# Altium schematic symbol library LATTICEPLDS_Library.SchLib: 291 symbols (part 1 of 32) (continued)
## iCE40HX8K-CT256 (continued)
part E pins: N13 VCC_SPI (power), P11 IOB_106_SDI (io), P12 IOB_105_SDO (io), R11 IOB_107_SCK (io), R12 IOB_108_SS (io)
part F pins: A4 GND (power), A12 GND (power), A14 VCC (power), D12 VPP_FAST (power), E7 GNDPLL1 (power), E8 VCCPLL1 (power), E12 VPP_2V5 (power), E15 GND (power), F6 VCC (power), F10 VCC (power), G7 GND (power), G8 GND (power), G9 GND (power), H7 GND (power), H8 GND (power), H9 GND (power), J7 GND (power), J8 GND (power), J9 GND (power), K2 GND (power), K6 VCC (power), K7 GND (power), K10 VCC (power), L2 VCC (power), L8 VCCPLL0 (power), L15 GND (power), N8 GNDPLL0 (power), N14 NC (power), R7 GND (power), T4 GND (power), T12 GND (power)
part A text: BANK0
part B text: BANK1
part C text: BANK2
part D text: BANK3
part E text: SPI
part F text: POWER

## iCE40LM1K-CM36
designator U?
pins: A1 PIOT_A1 / I2C2_SDA (io), A2 PIOT_A2 (power), A3 PIOT_A3HD (io), A4 PIOT_A4HD (io), A5 PIOT_A5HD (io), A6 PIOT_A6 / I2C1_SCL (io), B1 PIOT_B1 (io), B2 PIOT_B2 / I2C2_SCL (io), B3 PIOT_B3 / G7 (io), B4 PIOT_B4 / G2 (power), B5 PIOT_B5 / I2C1_SDA (io), B6 PIOT_B6 (io), C1 PIOB_C1 / SPI2_CSN (io), C2 Vccio_0 (power), C3 GND (power), C4 Vcc_12 (power), C5 PIOT_C5 (io), C6 PIOB_C6 / SPI1_MISO (io), D1 PIOB_D1 / SPI2_MOSI  /  G1 (io), D2 VCCPLL (power), D3 Vccio_2 (power), D4 GND (power), D5 CRESETB (io), D6 PIOB_D6 / SPI1_SCK (io), E1 PIOB_E1 /  SPI2_SCK (io), E2 PIOB_E2 / G3 (io), E3 PIOB_E3 (io), E4 CDONE (io), E5 PIOB_E5 (io), E6 PIOB_E6 / SPI1_CSN (io), F1 PIOB_F1 / SPI2_MISO (io), F2 PIOB_F2 (io), F3 PIOB_F3 / G6 (io), F4 PIOB_F4 / G0 (io), F5 PIOB_F5 (io), F6 PIOB_F6 / SPI1_MOSI (io)
text: BANK TOP; BANK BOTTOM

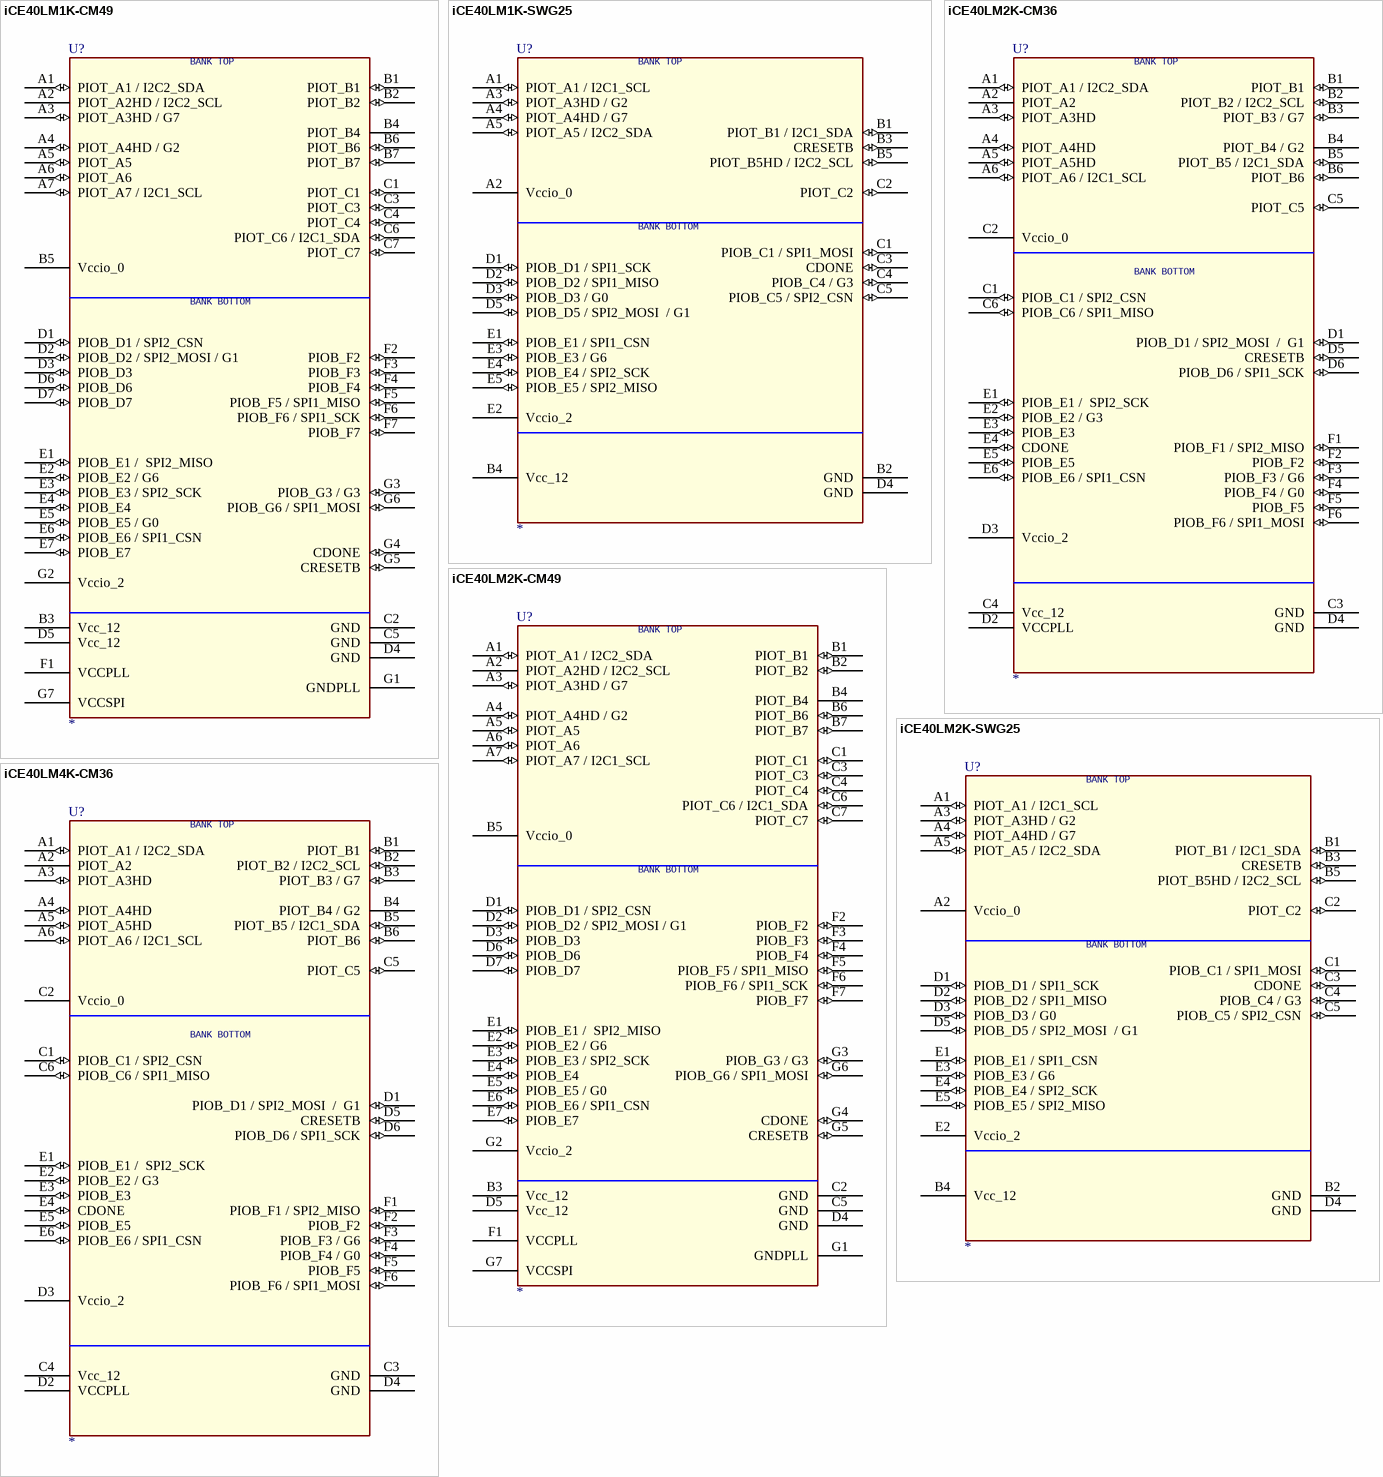
[diagram p7: symbols iCE40LM1K-CM49 to iCE40LM4K-CM36]

## iCE40LM1K-CM49
designator U?
pins: A1 PIOT_A1 / I2C2_SDA (io), A2 PIOT_A2HD / I2C2_SCL (power), A3 PIOT_A3HD / G7 (io), A4 PIOT_A4HD / G2 (io), A5 PIOT_A5 (io), A6 PIOT_A6 (io), A7 PIOT_A7 / I2C1_SCL (io), B1 PIOT_B1 (io), B2 PIOT_B2 (io), B3 Vcc_12 (power), B4 PIOT_B4 (power), B5 Vccio_0 (power), B6 PIOT_B6 (io), B7 PIOT_B7 (io), C1 PIOT_C1 (io), C2 GND (power), C3 PIOT_C3 (io), C4 PIOT_C4 (io), C5 GND (power), C6 PIOT_C6 / I2C1_SDA (io), C7 PIOT_C7 (io), D1 PIOB_D1 / SPI2_CSN (io), D2 PIOB_D2 / SPI2_MOSI / G1 (io), D3 PIOB_D3 (io), D4 GND (power), D5 Vcc_12 (power), D6 PIOB_D6 (io), D7 PIOB_D7 (io), E1 PIOB_E1 /  SPI2_MISO (io), E2 PIOB_E2 / G6 (io), E3 PIOB_E3 / SPI2_SCK (io), E4 PIOB_E4 (io), E5 PIOB_E5 / G0 (io), E6 PIOB_E6 / SPI1_CSN (io), E7 PIOB_E7 (io), F1 VCCPLL (power), F2 PIOB_F2 (io), F3 PIOB_F3 (io), F4 PIOB_F4 (io), F5 PIOB_F5 / SPI1_MISO (io), F6 PIOB_F6 / SPI1_SCK (io), F7 PIOB_F7 (io), G1 GNDPLL (power), G2 Vccio_2 (power), G3 PIOB_G3 / G3 (io), G4 CDONE (io), G5 CRESETB (io), G6 PIOB_G6 / SPI1_MOSI (io), G7 VCCSPI (power)
text: BANK TOP; BANK BOTTOM

## iCE40LM1K-SWG25
designator U?
pins: A1 PIOT_A1 / I2C1_SCL (io), A2 Vccio_0 (power), A3 PIOT_A3HD / G2 (io), A4 PIOT_A4HD / G7 (io), A5 PIOT_A5 / I2C2_SDA (io), B1 PIOT_B1 / I2C1_SDA (io), B2 GND (power), B3 CRESETB (io), B4 Vcc_12 (power), B5 PIOT_B5HD / I2C2_SCL (io), C1 PIOB_C1 / SPI1_MOSI (io), C2 PIOT_C2 (io), C3 CDONE (io), C4 PIOB_C4 / G3 (io), C5 PIOB_C5 / SPI2_CSN (io), D1 PIOB_D1 / SPI1_SCK (io), D2 PIOB_D2 / SPI1_MISO (io), D3 PIOB_D3 / G0 (io), D4 GND (power), D5 PIOB_D5 / SPI2_MOSI  / G1 (io), E1 PIOB_E1 / SPI1_CSN (io), E2 Vccio_2 (power), E3 PIOB_E3 / G6 (io), E4 PIOB_E4 / SPI2_SCK (io), E5 PIOB_E5 / SPI2_MISO (io)
text: BANK TOP; BANK BOTTOM

## iCE40LM2K-CM36
designator U?
pins: A1 PIOT_A1 / I2C2_SDA (io), A2 PIOT_A2 (power), A3 PIOT_A3HD (io), A4 PIOT_A4HD (io), A5 PIOT_A5HD (io), A6 PIOT_A6 / I2C1_SCL (io), B1 PIOT_B1 (io), B2 PIOT_B2 / I2C2_SCL (io), B3 PIOT_B3 / G7 (io), B4 PIOT_B4 / G2 (power), B5 PIOT_B5 / I2C1_SDA (io), B6 PIOT_B6 (io), C1 PIOB_C1 / SPI2_CSN (io), C2 Vccio_0 (power), C3 GND (power), C4 Vcc_12 (power), C5 PIOT_C5 (io), C6 PIOB_C6 / SPI1_MISO (io), D1 PIOB_D1 / SPI2_MOSI  /  G1 (io), D2 VCCPLL (power), D3 Vccio_2 (power), D4 GND (power), D5 CRESETB (io), D6 PIOB_D6 / SPI1_SCK (io), E1 PIOB_E1 /  SPI2_SCK (io), E2 PIOB_E2 / G3 (io), E3 PIOB_E3 (io), E4 CDONE (io), E5 PIOB_E5 (io), E6 PIOB_E6 / SPI1_CSN (io), F1 PIOB_F1 / SPI2_MISO (io), F2 PIOB_F2 (io), F3 PIOB_F3 / G6 (io), F4 PIOB_F4 / G0 (io), F5 PIOB_F5 (io), F6 PIOB_F6 / SPI1_MOSI (io)
text: BANK TOP; BANK BOTTOM

## iCE40LM2K-CM49
designator U?
pins: A1 PIOT_A1 / I2C2_SDA (io), A2 PIOT_A2HD / I2C2_SCL (power), A3 PIOT_A3HD / G7 (io), A4 PIOT_A4HD / G2 (io), A5 PIOT_A5 (io), A6 PIOT_A6 (io), A7 PIOT_A7 / I2C1_SCL (io), B1 PIOT_B1 (io), B2 PIOT_B2 (io), B3 Vcc_12 (power), B4 PIOT_B4 (power), B5 Vccio_0 (power), B6 PIOT_B6 (io), B7 PIOT_B7 (io), C1 PIOT_C1 (io), C2 GND (power), C3 PIOT_C3 (io), C4 PIOT_C4 (io), C5 GND (power), C6 PIOT_C6 / I2C1_SDA (io), C7 PIOT_C7 (io), D1 PIOB_D1 / SPI2_CSN (io), D2 PIOB_D2 / SPI2_MOSI / G1 (io), D3 PIOB_D3 (io), D4 GND (power), D5 Vcc_12 (power), D6 PIOB_D6 (io), D7 PIOB_D7 (io), E1 PIOB_E1 /  SPI2_MISO (io), E2 PIOB_E2 / G6 (io), E3 PIOB_E3 / SPI2_SCK (io), E4 PIOB_E4 (io), E5 PIOB_E5 / G0 (io), E6 PIOB_E6 / SPI1_CSN (io), E7 PIOB_E7 (io), F1 VCCPLL (power), F2 PIOB_F2 (io), F3 PIOB_F3 (io), F4 PIOB_F4 (io), F5 PIOB_F5 / SPI1_MISO (io), F6 PIOB_F6 / SPI1_SCK (io), F7 PIOB_F7 (io), G1 GNDPLL (power), G2 Vccio_2 (power), G3 PIOB_G3 / G3 (io), G4 CDONE (io), G5 CRESETB (io), G6 PIOB_G6 / SPI1_MOSI (io), G7 VCCSPI (power)
text: BANK TOP; BANK BOTTOM

## iCE40LM2K-SWG25
designator U?
pins: A1 PIOT_A1 / I2C1_SCL (io), A2 Vccio_0 (power), A3 PIOT_A3HD / G2 (io), A4 PIOT_A4HD / G7 (io), A5 PIOT_A5 / I2C2_SDA (io), B1 PIOT_B1 / I2C1_SDA (io), B2 GND (power), B3 CRESETB (io), B4 Vcc_12 (power), B5 PIOT_B5HD / I2C2_SCL (io), C1 PIOB_C1 / SPI1_MOSI (io), C2 PIOT_C2 (io), C3 CDONE (io), C4 PIOB_C4 / G3 (io), C5 PIOB_C5 / SPI2_CSN (io), D1 PIOB_D1 / SPI1_SCK (io), D2 PIOB_D2 / SPI1_MISO (io), D3 PIOB_D3 / G0 (io), D4 GND (power), D5 PIOB_D5 / SPI2_MOSI  / G1 (io), E1 PIOB_E1 / SPI1_CSN (io), E2 Vccio_2 (power), E3 PIOB_E3 / G6 (io), E4 PIOB_E4 / SPI2_SCK (io), E5 PIOB_E5 / SPI2_MISO (io)
text: BANK TOP; BANK BOTTOM

## iCE40LM4K-CM36
designator U?
pins: A1 PIOT_A1 / I2C2_SDA (io), A2 PIOT_A2 (power), A3 PIOT_A3HD (io), A4 PIOT_A4HD (io), A5 PIOT_A5HD (io), A6 PIOT_A6 / I2C1_SCL (io), B1 PIOT_B1 (io), B2 PIOT_B2 / I2C2_SCL (io), B3 PIOT_B3 / G7 (io), B4 PIOT_B4 / G2 (power), B5 PIOT_B5 / I2C1_SDA (io), B6 PIOT_B6 (io), C1 PIOB_C1 / SPI2_CSN (io), C2 Vccio_0 (power), C3 GND (power), C4 Vcc_12 (power), C5 PIOT_C5 (io), C6 PIOB_C6 / SPI1_MISO (io), D1 PIOB_D1 / SPI2_MOSI  /  G1 (io), D2 VCCPLL (power), D3 Vccio_2 (power), D4 GND (power), D5 CRESETB (io), D6 PIOB_D6 / SPI1_SCK (io), E1 PIOB_E1 /  SPI2_SCK (io), E2 PIOB_E2 / G3 (io), E3 PIOB_E3 (io), E4 CDONE (io), E5 PIOB_E5 (io), E6 PIOB_E6 / SPI1_CSN (io), F1 PIOB_F1 / SPI2_MISO (io), F2 PIOB_F2 (io), F3 PIOB_F3 / G6 (io), F4 PIOB_F4 / G0 (io), F5 PIOB_F5 (io), F6 PIOB_F6 / SPI1_MOSI (io)
text: BANK TOP; BANK BOTTOM

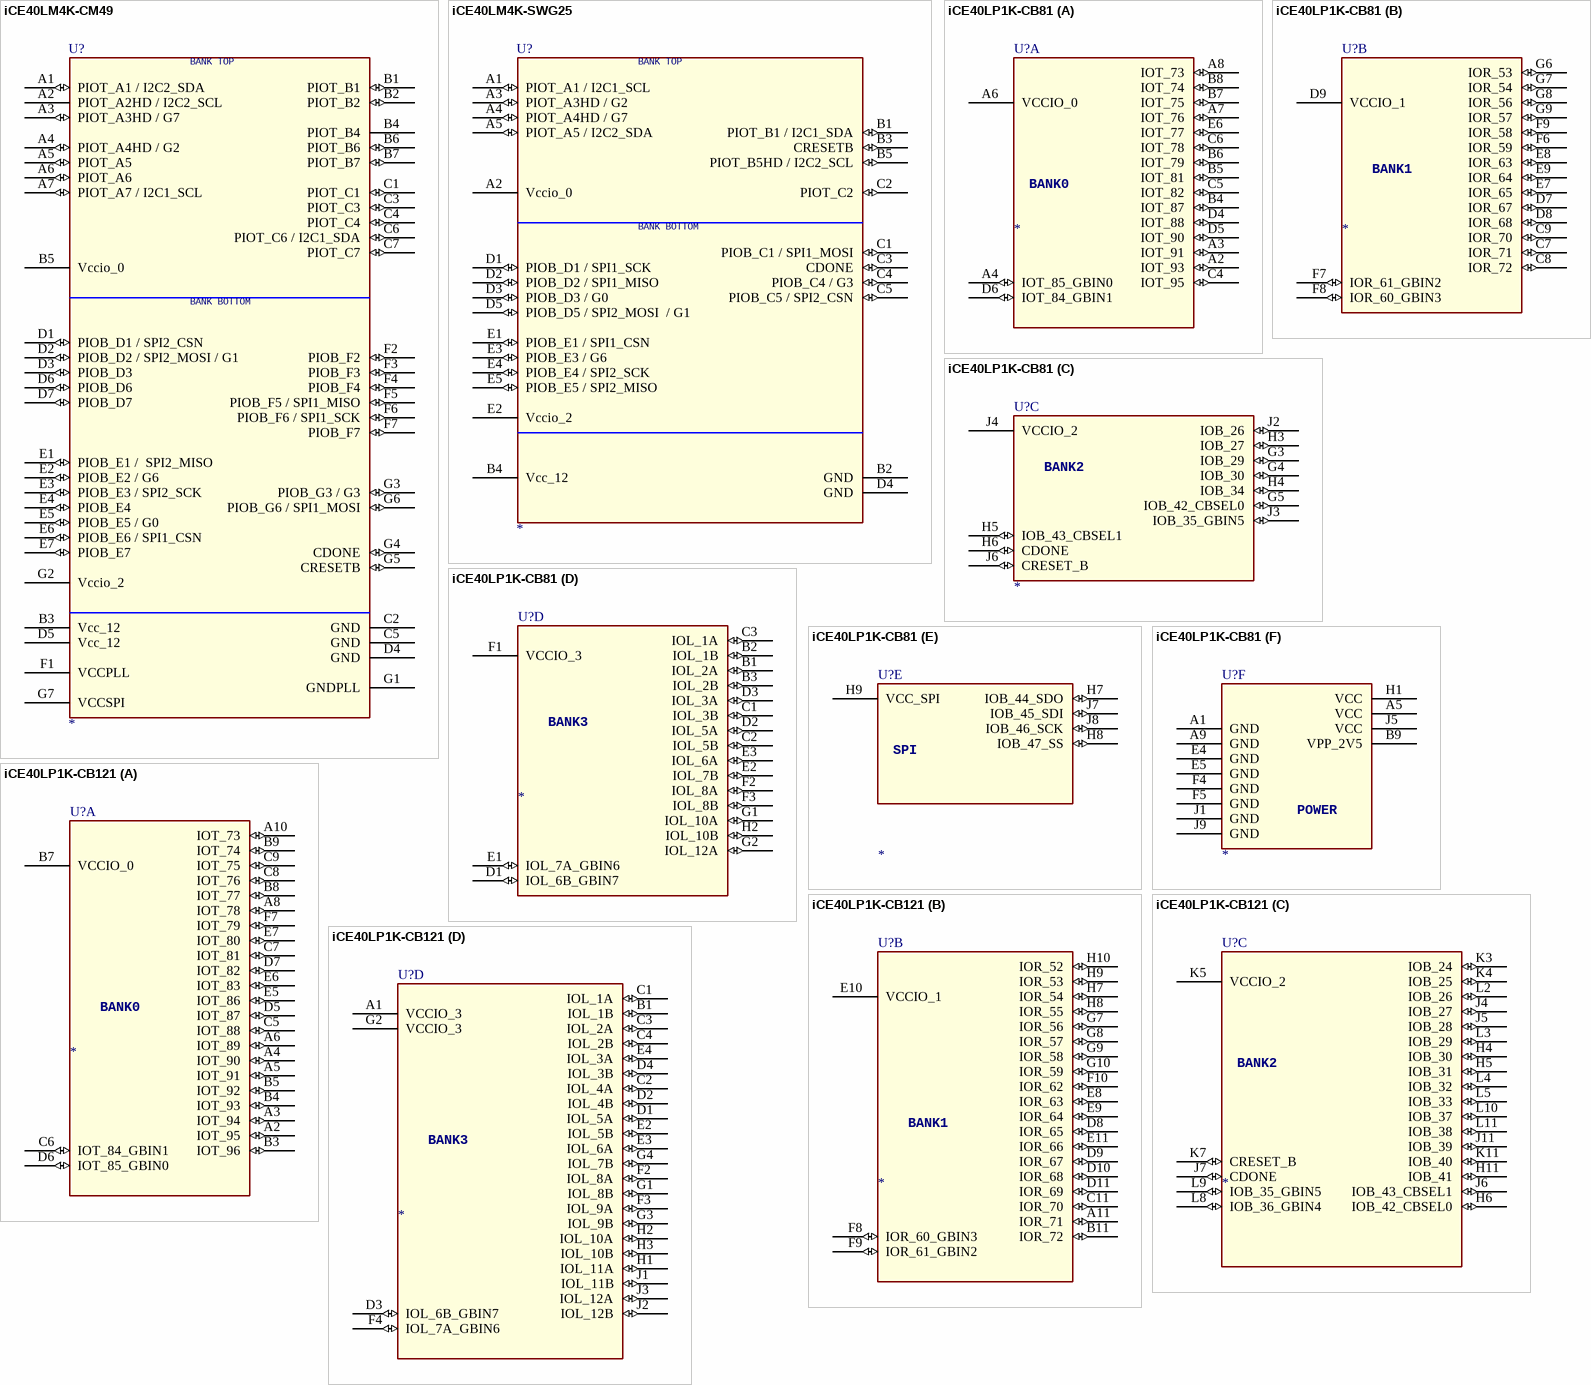
[diagram p8: symbols iCE40LM4K-CM49 to iCE40LP1K-CB121]

## iCE40LM4K-CM49
designator U?
pins: A1 PIOT_A1 / I2C2_SDA (io), A2 PIOT_A2HD / I2C2_SCL (power), A3 PIOT_A3HD / G7 (io), A4 PIOT_A4HD / G2 (io), A5 PIOT_A5 (io), A6 PIOT_A6 (io), A7 PIOT_A7 / I2C1_SCL (io), B1 PIOT_B1 (io), B2 PIOT_B2 (io), B3 Vcc_12 (power), B4 PIOT_B4 (power), B5 Vccio_0 (power), B6 PIOT_B6 (io), B7 PIOT_B7 (io), C1 PIOT_C1 (io), C2 GND (power), C3 PIOT_C3 (io), C4 PIOT_C4 (io), C5 GND (power), C6 PIOT_C6 / I2C1_SDA (io), C7 PIOT_C7 (io), D1 PIOB_D1 / SPI2_CSN (io), D2 PIOB_D2 / SPI2_MOSI / G1 (io), D3 PIOB_D3 (io), D4 GND (power), D5 Vcc_12 (power), D6 PIOB_D6 (io), D7 PIOB_D7 (io), E1 PIOB_E1 /  SPI2_MISO (io), E2 PIOB_E2 / G6 (io), E3 PIOB_E3 / SPI2_SCK (io), E4 PIOB_E4 (io), E5 PIOB_E5 / G0 (io), E6 PIOB_E6 / SPI1_CSN (io), E7 PIOB_E7 (io), F1 VCCPLL (power), F2 PIOB_F2 (io), F3 PIOB_F3 (io), F4 PIOB_F4 (io), F5 PIOB_F5 / SPI1_MISO (io), F6 PIOB_F6 / SPI1_SCK (io), F7 PIOB_F7 (io), G1 GNDPLL (power), G2 Vccio_2 (power), G3 PIOB_G3 / G3 (io), G4 CDONE (io), G5 CRESETB (io), G6 PIOB_G6 / SPI1_MOSI (io), G7 VCCSPI (power)
text: BANK TOP; BANK BOTTOM

## iCE40LM4K-SWG25
designator U?
pins: A1 PIOT_A1 / I2C1_SCL (io), A2 Vccio_0 (power), A3 PIOT_A3HD / G2 (io), A4 PIOT_A4HD / G7 (io), A5 PIOT_A5 / I2C2_SDA (io), B1 PIOT_B1 / I2C1_SDA (io), B2 GND (power), B3 CRESETB (io), B4 Vcc_12 (power), B5 PIOT_B5HD / I2C2_SCL (io), C1 PIOB_C1 / SPI1_MOSI (io), C2 PIOT_C2 (io), C3 CDONE (io), C4 PIOB_C4 / G3 (io), C5 PIOB_C5 / SPI2_CSN (io), D1 PIOB_D1 / SPI1_SCK (io), D2 PIOB_D2 / SPI1_MISO (io), D3 PIOB_D3 / G0 (io), D4 GND (power), D5 PIOB_D5 / SPI2_MOSI  / G1 (io), E1 PIOB_E1 / SPI1_CSN (io), E2 Vccio_2 (power), E3 PIOB_E3 / G6 (io), E4 PIOB_E4 / SPI2_SCK (io), E5 PIOB_E5 / SPI2_MISO (io)
text: BANK TOP; BANK BOTTOM

## iCE40LP1K-CB81
designator U?
SWAP_INFO: (S1+S2+S3+S4+S5+S6); SPLIT_INST: TRUE
part A pins: A2 IOT_93 (io), A3 IOT_91 (io), A4 IOT_85_GBIN0 (io), A6 VCCIO_0 (power), A7 IOT_76 (io), A8 IOT_73 (io), B4 IOT_87 (io), B5 IOT_81 (io), B6 IOT_79 (io), B7 IOT_75 (io), B8 IOT_74 (io), C4 IOT_95 (io), C5 IOT_82 (io), C6 IOT_78 (io), D4 IOT_88 (io), D5 IOT_90 (io), D6 IOT_84_GBIN1 (io), E6 IOT_77 (io)
part B pins: C7 IOR_71 (io), C8 IOR_72 (io), C9 IOR_70 (io), D7 IOR_67 (io), D8 IOR_68 (io), D9 VCCIO_1 (power), E7 IOR_65 (io), E8 IOR_63 (io), E9 IOR_64 (io), F6 IOR_59 (io), F7 IOR_61_GBIN2 (io), F8 IOR_60_GBIN3 (io), F9 IOR_58 (io), G6 IOR_53 (io), G7 IOR_54 (io), G8 IOR_56 (io), G9 IOR_57 (io)
part C pins: G3 IOB_29 (io), G4 IOB_30 (io), G5 IOB_42_CBSEL0 (io), H3 IOB_27 (io), H4 IOB_34 (io), H5 IOB_43_CBSEL1 (io), H6 CDONE (io), J2 IOB_26 (io), J3 IOB_35_GBIN5 (io), J4 VCCIO_2 (power), J6 CRESET_B (io)
part D pins: B1 IOL_2A (io), B2 IOL_1B (io), B3 IOL_2B (io), C1 IOL_3B (io), C2 IOL_5B (io), C3 IOL_1A (io), D1 IOL_6B_GBIN7 (io), D2 IOL_5A (io), D3 IOL_3A (io), E1 IOL_7A_GBIN6 (io), E2 IOL_7B (io), E3 IOL_6A (io), F1 VCCIO_3 (power), F2 IOL_8A (io), F3 IOL_8B (io), G1 IOL_10A (io), G2 IOL_12A (io), H2 IOL_10B (io)
part E pins: H7 IOB_44_SDO (io), H8 IOB_47_SS (io), H9 VCC_SPI (power), J7 IOB_45_SDI (io), J8 IOB_46_SCK (io)
part F pins: A1 GND (power), A5 VCC (power), A9 GND (power), B9 VPP_2V5 (power), E4 GND (power), E5 GND (power), F4 GND (power), F5 GND (power), H1 VCC (power), J1 GND (power), J5 VCC (power), J9 GND (power)
part A text: BANK0
part B text: BANK1
part C text: BANK2
part D text: BANK3
part E text: SPI
part F text: POWER

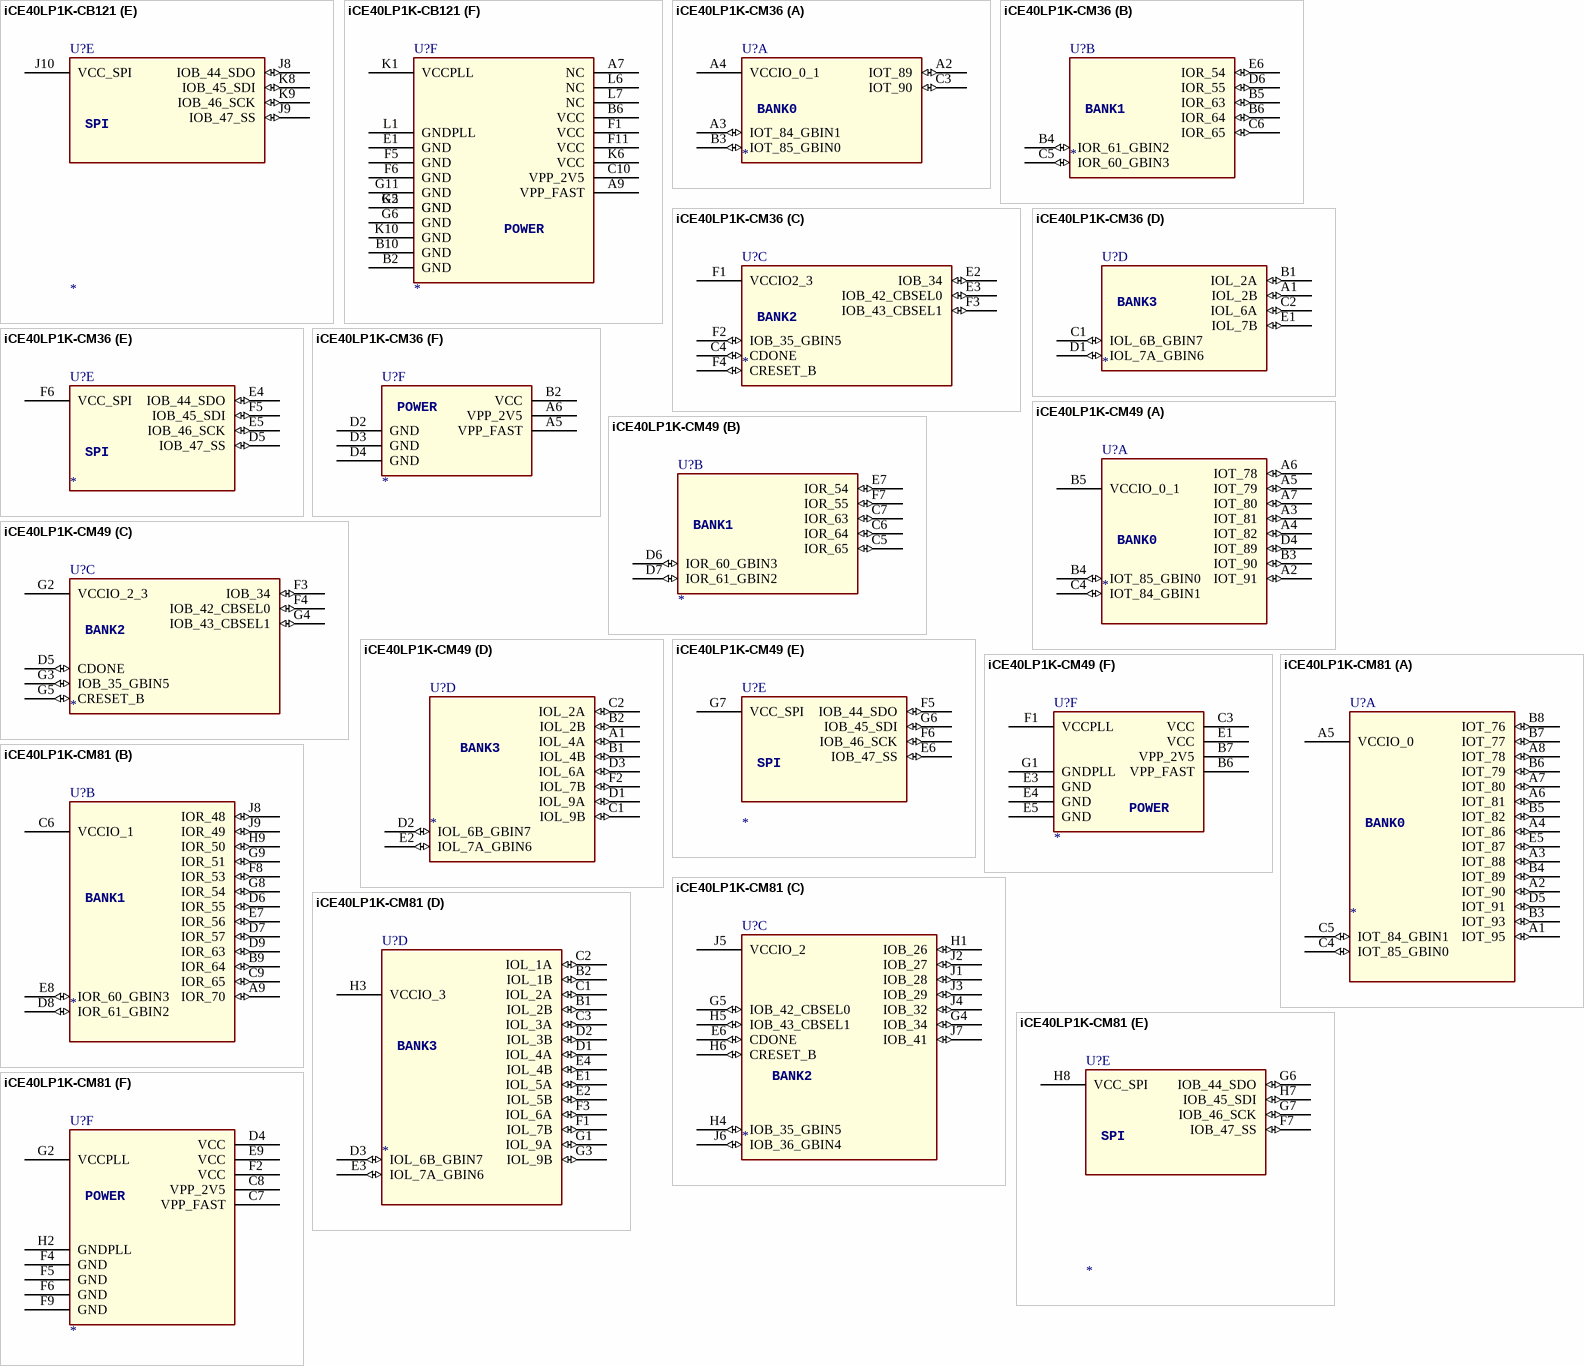
[diagram p9: symbols iCE40LP1K-CB121 to iCE40LP1K-CM81]

## iCE40LP1K-CB121
designator U?
SWAP_INFO: (S1+S2+S3+S4+S5+S6); SPLIT_INST: TRUE
part A pins: A2 IOT_95 (io), A3 IOT_94 (io), A4 IOT_90 (io), A5 IOT_91 (io), A6 IOT_89 (io), A8 IOT_78 (io), A10 IOT_73 (io), B3 IOT_96 (io), B4 IOT_93 (io), B5 IOT_92 (io), B7 VCCIO_0 (power), B8 IOT_77 (io), B9 IOT_74 (io), C5 IOT_88 (io), C6 IOT_84_GBIN1 (io), C7 IOT_81 (io), C8 IOT_76 (io), C9 IOT_75 (io), D5 IOT_87 (io), D6 IOT_85_GBIN0 (io), D7 IOT_82 (io), E5 IOT_86 (io), E6 IOT_83 (io), E7 IOT_80 (io), F7 IOT_79 (io)
part B pins: A11 IOR_71 (io), B11 IOR_72 (io), C11 IOR_70 (io), D8 IOR_65 (io), D9 IOR_67 (io), D10 IOR_68 (io), D11 IOR_69 (io), E8 IOR_63 (io), E9 IOR_64 (io), E10 VCCIO_1 (power), E11 IOR_66 (io), F8 IOR_60_GBIN3 (io), F9 IOR_61_GBIN2 (io), F10 IOR_62 (io), G7 IOR_56 (io), G8 IOR_57 (io), G9 IOR_58 (io), G10 IOR_59 (io), H7 IOR_54 (io), H8 IOR_55 (io), H9 IOR_53 (io), H10 IOR_52 (io)
part C pins: H4 IOB_30 (io), H5 IOB_31 (io), H6 IOB_42_CBSEL0 (io), H11 IOB_41 (io), J4 IOB_27 (io), J5 IOB_28 (io), J6 IOB_43_CBSEL1 (io), J7 CDONE (io), J11 IOB_39 (io), K3 IOB_24 (io), K4 IOB_25 (io), K5 VCCIO_2 (power), K7 CRESET_B (io), K11 IOB_40 (io), L2 IOB_26 (io), L3 IOB_29 (io), L4 IOB_32 (io), L5 IOB_33 (io), L8 IOB_36_GBIN4 (io), L9 IOB_35_GBIN5 (io), L10 IOB_37 (io), L11 IOB_38 (io)
part D pins: A1 VCCIO_3 (power), B1 IOL_1B (io), C1 IOL_1A (io), C2 IOL_4A (io), C3 IOL_2A (io), C4 IOL_2B (io), D1 IOL_5A (io), D2 IOL_4B (io), D3 IOL_6B_GBIN7 (io), D4 IOL_3B (io), E2 IOL_5B (io), E3 IOL_6A (io), E4 IOL_3A (io), F2 IOL_8A (io), F3 IOL_9A (io), F4 IOL_7A_GBIN6 (io), G1 IOL_8B (io), G2 VCCIO_3 (power), G3 IOL_9B (io), G4 IOL_7B (io), H1 IOL_11A (io), H2 IOL_10A (io), H3 IOL_10B (io), J1 IOL_11B (io), J2 IOL_12B (io), J3 IOL_12A (io)
part E pins: J8 IOB_44_SDO (io), J9 IOB_47_SS (io), J10 VCC_SPI (power), K8 IOB_45_SDI (io), K9 IOB_46_SCK (io)
part F pins: A7 NC (power), A9 VPP_FAST (power), B2 GND (power), B6 VCC (power), B10 GND (power), C10 VPP_2V5 (power), E1 GND (power), F1 VCC (power), F5 GND (power), F6 GND (power), F11 VCC (power), G5 GND (power), G6 GND (power), G11 GND (power), K1 VCCPLL (power), K2 GND (power), K6 VCC (power), K10 GND (power), L1 GNDPLL (power), L6 NC (power), L7 NC (power)
part A text: BANK0
part B text: BANK1
part C text: BANK2
part D text: BANK3
part E text: SPI
part F text: POWER

## iCE40LP1K-CM36
designator U?
SWAP_INFO: (S1+S2+S3+S4+S5+S6); SPLIT_INST: TRUE
part A pins: A2 IOT_89 (io), A3 IOT_84_GBIN1 (io), A4 VCCIO_0_1 (power), B3 IOT_85_GBIN0 (io), C3 IOT_90 (io)
part B pins: B4 IOR_61_GBIN2 (io), B5 IOR_63 (io), B6 IOR_64 (io), C5 IOR_60_GBIN3 (io), C6 IOR_65 (io), D6 IOR_55 (io), E6 IOR_54 (io)
part C pins: C4 CDONE (io), E2 IOB_34 (io), E3 IOB_42_CBSEL0 (io), F1 VCCIO2_3 (power), F2 IOB_35_GBIN5 (io), F3 IOB_43_CBSEL1 (io), F4 CRESET_B (io)
part D pins: A1 IOL_2B (io), B1 IOL_2A (io), C1 IOL_6B_GBIN7 (io), C2 IOL_6A (io), D1 IOL_7A_GBIN6 (io), E1 IOL_7B (io)
part E pins: D5 IOB_47_SS (io), E4 IOB_44_SDO (io), E5 IOB_46_SCK (io), F5 IOB_45_SDI (io), F6 VCC_SPI (power)
part F pins: A5 VPP_FAST (power), A6 VPP_2V5 (power), B2 VCC (power), D2 GND (power), D3 GND (power), D4 GND (power)
part A text: BANK0
part B text: BANK1
part C text: BANK2
part D text: BANK3
part E text: SPI
part F text: POWER

## iCE40LP1K-CM49
designator U?
SWAP_INFO: (S1+S2+S3+S4+S5+S6); SPLIT_INST: TRUE
part A pins: A2 IOT_91 (io), A3 IOT_81 (io), A4 IOT_82 (io), A5 IOT_79 (io), A6 IOT_78 (io), A7 IOT_80 (io), B3 IOT_90 (io), B4 IOT_85_GBIN0 (io), B5 VCCIO_0_1 (power), C4 IOT_84_GBIN1 (io), D4 IOT_89 (io)
part B pins: C5 IOR_65 (io), C6 IOR_64 (io), C7 IOR_63 (io), D6 IOR_60_GBIN3 (io), D7 IOR_61_GBIN2 (io), E7 IOR_54 (io), F7 IOR_55 (io)
part C pins: D5 CDONE (io), F3 IOB_34 (io), F4 IOB_42_CBSEL0 (io), G2 VCCIO_2_3 (power), G3 IOB_35_GBIN5 (io), G4 IOB_43_CBSEL1 (io), G5 CRESET_B (io)
part D pins: A1 IOL_4A (io), B1 IOL_4B (io), B2 IOL_2B (io), C1 IOL_9B (io), C2 IOL_2A (io), D1 IOL_9A (io), D2 IOL_6B_GBIN7 (io), D3 IOL_6A (io), E2 IOL_7A_GBIN6 (io), F2 IOL_7B (io)
part E pins: E6 IOB_47_SS (io), F5 IOB_44_SDO (io), F6 IOB_46_SCK (io), G6 IOB_45_SDI (io), G7 VCC_SPI (power)
part F pins: B6 VPP_FAST (power), B7 VPP_2V5 (power), C3 VCC (power), E1 VCC (power), E3 GND (power), E4 GND (power), E5 GND (power), F1 VCCPLL (power), G1 GNDPLL (power)
part A text: BANK0
part B text: BANK1
part C text: BANK2
part D text: BANK3
part E text: SPI
part F text: POWER

## iCE40LP1K-CM81
designator U?
SPLIT_INST: TRUE; SWAP_INFO: (S1+S2+S3+S4+S5+S6)
part A pins: A1 IOT_95 (io), A2 IOT_90 (io), A3 IOT_88 (io), A4 IOT_86 (io), A5 VCCIO_0 (power), A6 IOT_81 (io), A7 IOT_80 (io), A8 IOT_78 (io), B3 IOT_93 (io), B4 IOT_89 (io), B5 IOT_82 (io), B6 IOT_79 (io), B7 IOT_77 (io), B8 IOT_76 (io), C4 IOT_85_GBIN0 (io), C5 IOT_84_GBIN1 (io), D5 IOT_91 (io), E5 IOT_87 (io)
part B pins: A9 IOR_70 (io), B9 IOR_64 (io), C6 VCCIO_1 (power), C9 IOR_65 (io), D6 IOR_55 (io), D7 IOR_57 (io), D8 IOR_61_GBIN2 (io), D9 IOR_63 (io), E7 IOR_56 (io), E8 IOR_60_GBIN3 (io), F8 IOR_53 (io), G8 IOR_54 (io), G9 IOR_51 (io), H9 IOR_50 (io), J8 IOR_48 (io), J9 IOR_49 (io)
part C pins: E6 CDONE (io), G4 IOB_34 (io), G5 IOB_42_CBSEL0 (io), H1 IOB_26 (io), H4 IOB_35_GBIN5 (io), H5 IOB_43_CBSEL1 (io), H6 CRESET_B (io), J1 IOB_28 (io), J2 IOB_27 (io), J3 IOB_29 (io), J4 IOB_32 (io), J5 VCCIO_2 (power), J6 IOB_36_GBIN4 (io), J7 IOB_41 (io)
part D pins: B1 IOL_2B (io), B2 IOL_1B (io), C1 IOL_2A (io), C2 IOL_1A (io), C3 IOL_3A (io), D1 IOL_4A (io), D2 IOL_3B (io), D3 IOL_6B_GBIN7 (io), E1 IOL_5A (io), E2 IOL_5B (io), E3 IOL_7A_GBIN6 (io), E4 IOL_4B (io), F1 IOL_7B (io), F3 IOL_6A (io), G1 IOL_9A (io), G3 IOL_9B (io), H3 VCCIO_3 (power)
part E pins: F7 IOB_47_SS (io), G6 IOB_44_SDO (io), G7 IOB_46_SCK (io), H7 IOB_45_SDI (io), H8 VCC_SPI (power)
part F pins: C7 VPP_FAST (power), C8 VPP_2V5 (power), D4 VCC (power), E9 VCC (power), F2 VCC (power), F4 GND (power), F5 GND (power), F6 GND (power), F9 GND (power), G2 VCCPLL (power), H2 GNDPLL (power)
part A text: BANK0
part B text: BANK1
part C text: BANK2
part D text: BANK3
part E text: SPI
part F text: POWER

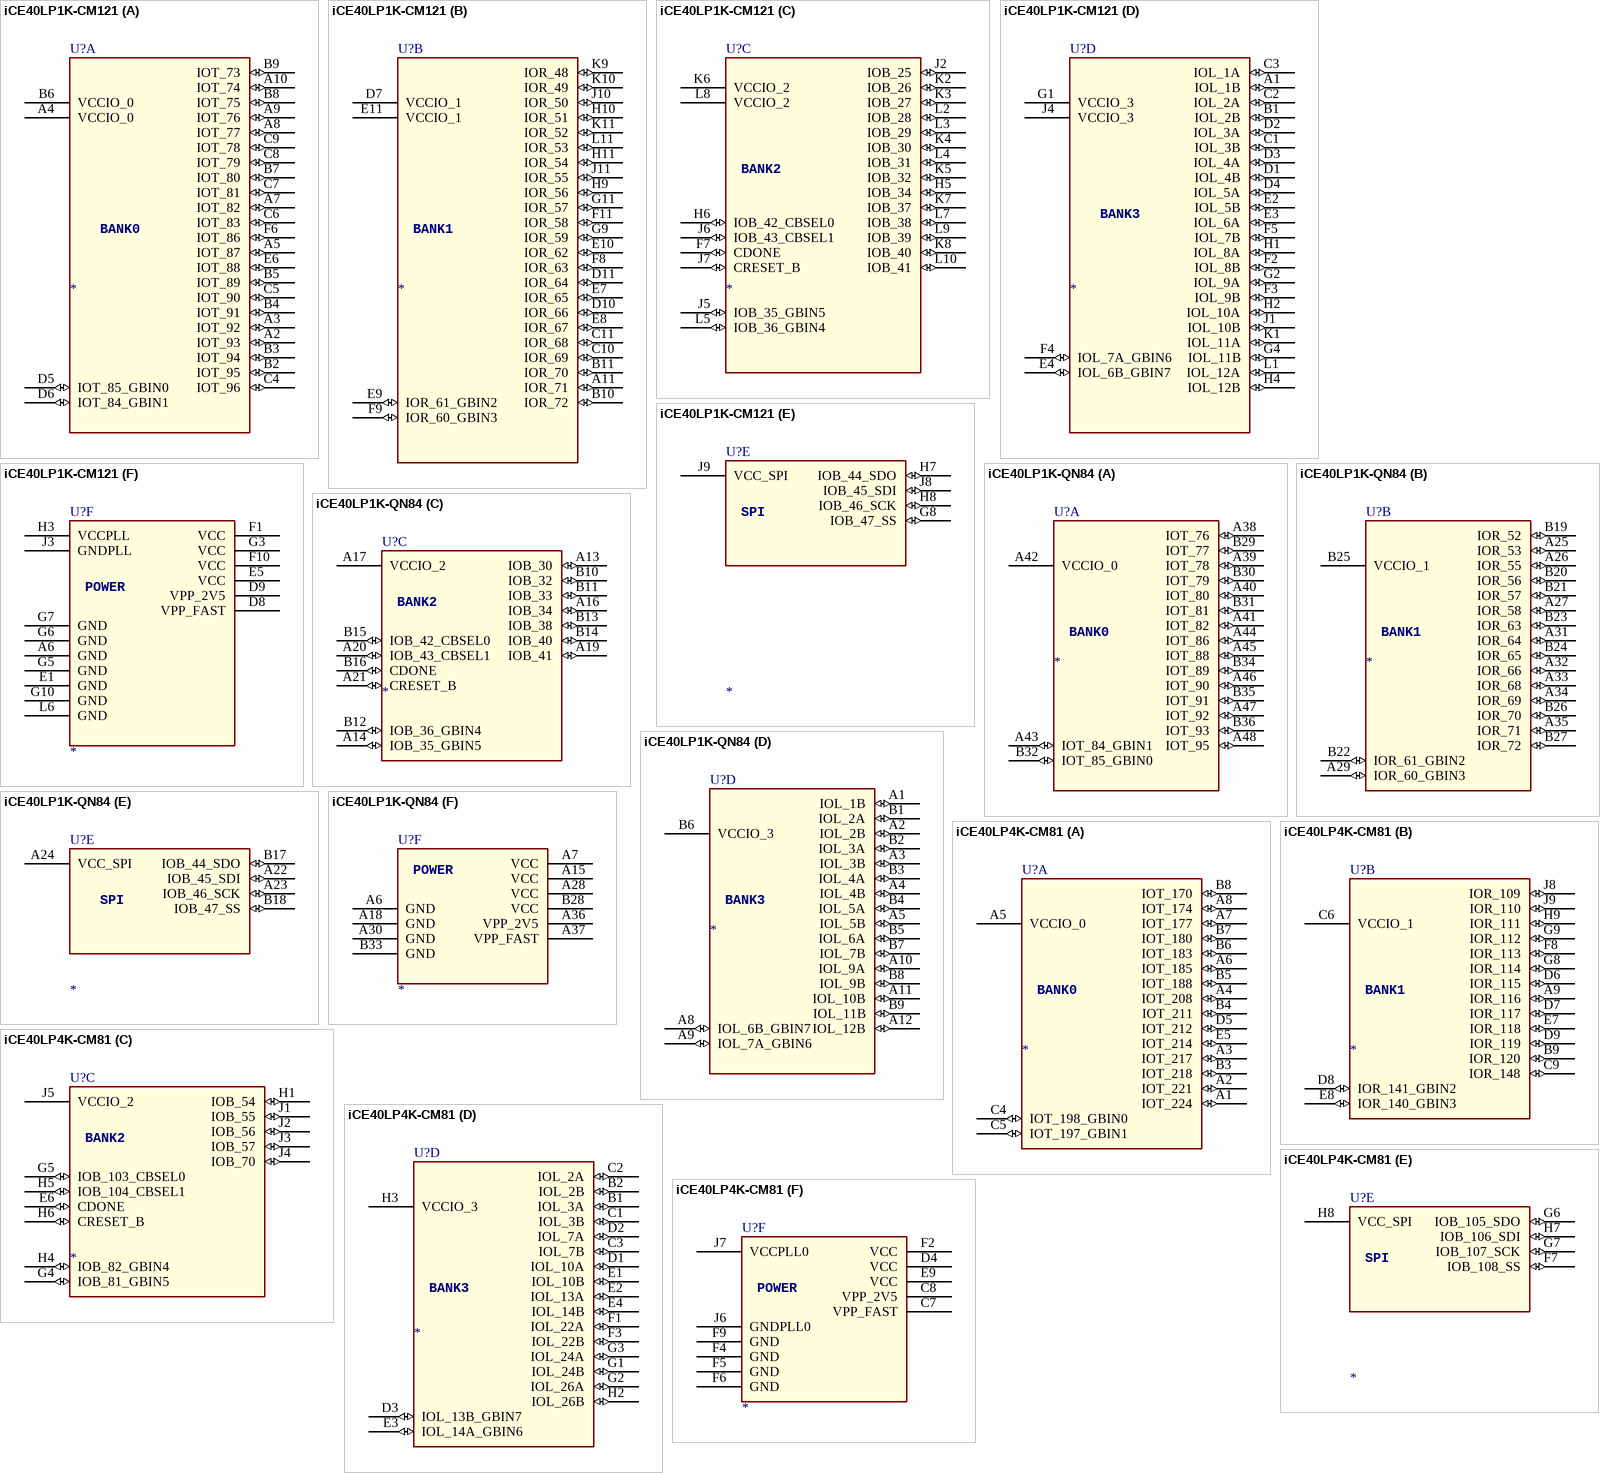
[diagram p10: symbols iCE40LP1K-CM121 to iCE40LP4K-CM81]